# Altium footprint library hphonglib.PcbLib: 1250 footprints (part 2 of 79)
Each footprint in its own frame and in the unit in brackets; x right, y up, seen from the top. Pads: shape width x height; smd on the part's side, far side on the other; paste and mask are expansions set on the pad; w line width, h text height; cw(c..) or ccw(c..) is an arc to the next point about the centre after c.
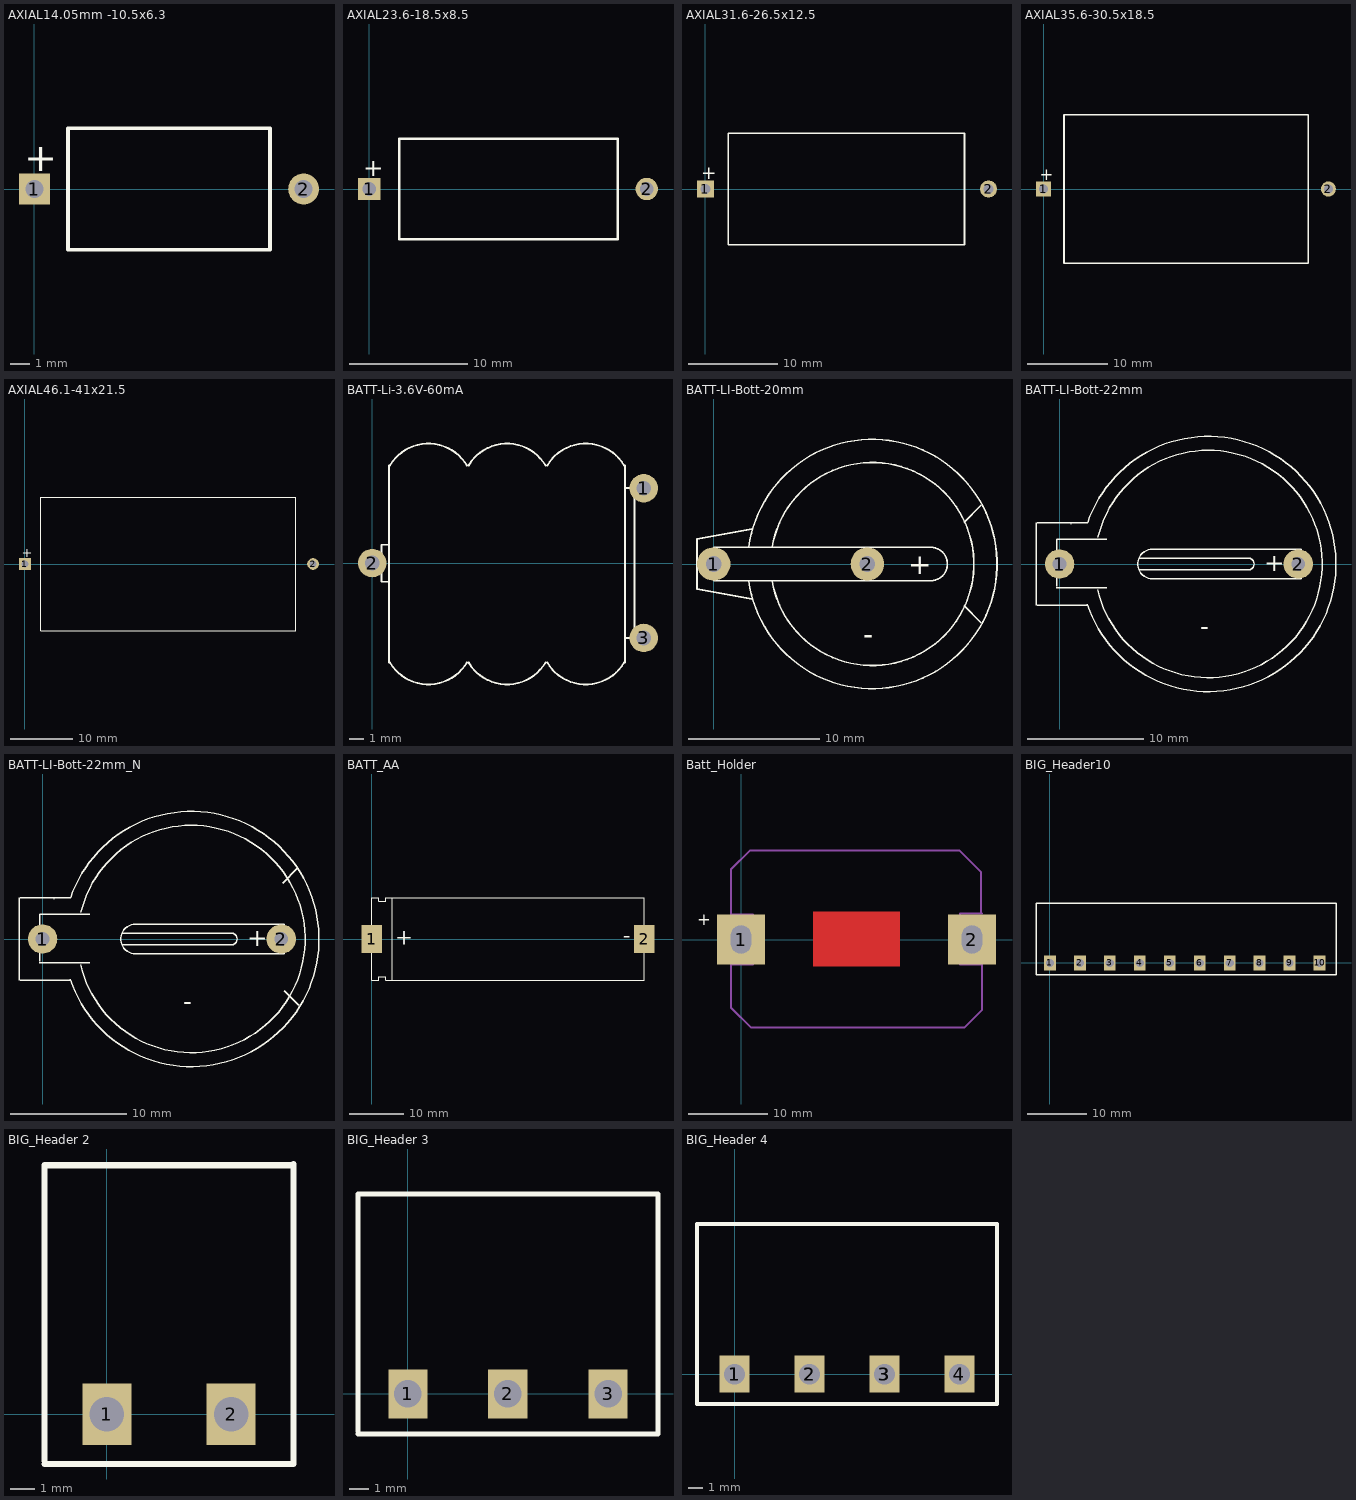
[diagram p1: the footprints below, top view; thin cyan lines are the x and y axes]

## AXIAL14.05mm -10.5x6.3 [mm] "Capacitor, Axial, Polarised; Body 10.5 x 6.3 mm (LxDia. max), Lead Dia. 0.6 mm (typ)"
height 5.08
pads (2):
  rect 1.6x1.6 hole 0.95: 1(0,0)
  round 1.6 hole 0.95: 2(13.97,0)
Top Overlay:
  lines w0.2: 1.735,-3.15 1.735,3.15 12.235,3.15 12.235,-3.15 1.735,-3.15
  text "+" at -0.54,0.925 h1.5

## AXIAL23.6-18.5x8.5 [mm] "Capacitor, Axial, Polarised; Body 18.5 x 8.5 mm (LxDia. max), Lead Dia. 0.8 mm (typ)"
height 5.08
pads (2):
  rect 1.9x1.9 hole 1.15: 1(0,0)
  round 1.9 hole 1.15: 2(23.495,0)
Top Overlay:
  lines w0.2: 2.55,-4.25 2.55,4.25 21.05,4.25 21.05,-4.25 2.55,-4.25
  text "+" at -0.5,1.075 h1.5

## AXIAL31.6-26.5x12.5 [mm] "Capacitor, Axial, Polarised; Body 26.5 x 12.5 mm (LxDia. max), Lead Dia. 0.8 mm (typ)"
height 5.08
pads (2):
  rect 1.9x1.9 hole 1.15: 1(0,0)
  round 1.9 hole 1.15: 2(31.75,0)
Top Overlay:
  lines w0.2: 2.55,-6.25 29.05,-6.25 29.05,6.25 2.55,6.25 2.55,-6.25
  text "+" at -0.5,1.075 h1.5

## AXIAL35.6-30.5x18.5 [mm] "Capacitor, Axial, Polarised; Body 30.5 x 18.5 mm (LxDia. max), Lead Dia. 0.8 mm (typ)"
height 5.08
pads (2):
  rect 1.9x1.9 hole 1.15: 1(0,0)
  round 1.9 hole 1.15: 2(35.56,0)
Top Overlay:
  lines w0.2: 2.55,-9.25 33.05,-9.25 33.05,9.25 2.55,9.25 2.55,-9.25
  text "+" at -0.5,1.075 h1.5

## AXIAL46.1-41x21.5 [mm] "Capacitor, Axial, Polarised; Body 41 x 21.5 mm (LxDia. max), Lead Dia. 0.8 mm (typ)"
height 5.08
pads (2):
  rect 1.9x1.9 hole 1.15: 1(0,0)
  round 1.9 hole 1.15: 2(46.355,0)
Top Overlay:
  lines w0.2: 2.55,-10.75 43.55,-10.75 43.55,10.75 2.55,10.75 2.55,-10.75
  text "+" at -0.5,1.075 h1.5

## BAT_LI_3.3V [mm]
3D body "Battery, CR2032.STEP": height 0.51, standoff -2.67, extent -9.982,-9.957 10.033,10.058

## BATT-Li-3.6V-60mA [mil]
pads (3):
  round 76 hole 39.37 unplated: 1(725,200) 2(0,0) 3(725,-200)
Top Overlay:
  lines w5: 44,-50 25,-50 25,49 44,49 ; 45,-265 45,260 ; 47.08,-265.14 ccw(c150,-205) 253.02,-264.96 ; 47.08,260.14 cw(c150,200) 253.02,259.96 ; 257.08,-265.14 ccw(c360,-205) 463.02,-264.96 ; 257.08,260.14 cw(c360,200) 463.02,259.96 ; 467.08,-265.14 ccw(c570,-205) 673.02,-264.96 ; 467.08,260.14 cw(c570,200) 673.02,259.96 ; 675,-265 675,260 ; 675,-200 700,-200 700,200 675,200
Mechanical 1:
  text "3.6 V" at 225,100 h60
  text "60mA" at 250,-25 h60
  text "+" at 597.64,-30.4 h60.8

## BATT-LI-Bott-20mm [mil]
pads (2):
  round 100 hole 47.24 unplated: 1(0,0) 2(460,0)
Top Overlay:
  lines w5: 105,-50.03 ccw(c475,0) 105,50.03 ; 115,-105 -50,-75 -50,75 115,105 ; 175.03,-50.2 ccw(c475,0) 175.03,50.2 ; 750,-125 800,-175 ; 750,125 800,175 ; 0,-50 650,-50 ccw(c650,0) 650,50 0,50 0,-50
  text "+" at 582.64,-30.4 h60.8
  text "-" at 447.64,-240.4 h60.8

## BATT-LI-Bott-22mm [mil]
pads (2):
  round 100 hole 47.24 unplated: 1(0,0) 2(810,0)
Top Overlay:
  lines w5: -80,-140 -80,140 ; -75.45,-140 95,-140 ; -75.45,140 95,140 ; -10.63,-80.04 159.83,-80.04 ; -9.78,-75 -9.78,83.62 160.68,83.62 ; 38.72,137.04 40.28,135.96 ; 94.15,-136.95 ccw(c505,0) 95.16,139.94 ; 129.15,-87.15 ccw(c505,0) 130.07,91.05 ; 270,-20 640,-20 ccw(c640,0) 640,20 270,20 ; 315,-50 cw(c315,0) 315,50 820,50 820,-50 315,-50
  text "+" at 695,-25 h60.8
  text "-" at 477.64,-240.4 h60.8
3D body: height 275.59, standoff 3.94, extent 93.5,-433.07 507.87,-79.72
3D body: height 275.59, standoff 7.87, extent 90.55,82.68 510.83,433.07
3D body: height 275.59, standoff 7.87, extent 507.87,-435.04 937.99,431.1
3D body: height 59.06, standoff 39.37, extent 264.76,-51.18 812.01,49.21
3D body: height 59.06, standoff 39.37, extent 4.92,-69.88 122.05,-28.54
3D body: height 59.06, standoff 39.37, extent 4.43,31.25 121.56,72.59
3D body: height 283.46, standoff 39.37, extent 120.08,-71.15 148.91,72.83
3D body: height 283.46, standoff 39.37, extent -19.68,-88.58 8.86,93.5
3D body: height 39.37, standoff 3.94, extent 120.08,-395.67 896.65,388.78
3D body: height 275.59, standoff 3.94, extent -80.71,-143.7 104.33,140.75

## BATT-LI-Bott-22mm_N [mil]
pads (2):
  round 100 hole 47.24 unplated: 1(0,0) 2(810,0)
Top Overlay:
  lines w5: -80,-140 -80,140 ; -75.45,-140 95,-140 ; -75.45,140 95,140 ; -10.63,-80.04 159.83,-80.04 ; -9.78,-75 -9.78,83.62 160.68,83.62 ; 38.72,137.04 40.28,135.96 ; 94.15,-136.95 ccw(c505,0) 95.16,139.94 ; 129.15,-87.15 ccw(c505,0) 130.07,91.05 ; 270,-20 640,-20 ccw(c640,0) 640,20 270,20 ; 815,190 865,240 ; 820,-175 870,-225 ; 315,-50 cw(c315,0) 315,50 820,50 820,-50 315,-50
  text "+" at 695,-25 h60.8
  text "-" at 477.64,-240.4 h60.8
3D body "Batt holder keystone 502.STEP": height 212, standoff -293, extent -27,-377 870,373

## BATT_AA [mm]
pads (2):
  rect 3.81x5.08 smd: 1(0,0) 2(50.165,0)
Top Overlay:
  lines w0.127: 3.81,-7.62 3.81,7.62 ; 0,-7.62 1.27,-7.62 1.27,-6.985 2.54,-6.985 2.54,-7.62 50.165,-7.62 50.165,7.62 2.54,7.62 2.54,6.985 1.27,6.985 1.27,7.62 0,7.62 0,-7.62
  text "-" at 47.658,1.448 h2.9
  text "+" at 7.653,1.448 h2.9
Mechanical 1:
  text "AA" at 22.86,-1.27 h2.9

## Batt_Holder [mil] "Battery Holders"
pads (2):
  rect 240x250 hole 102 slot 140 at 90 deg: 1(0,0) 2(1154,0)
Top Layer:
  rectangle: 360,-135 795,140
Top Overlay:
  text "+" at -220,70 h60
Mechanical 5:
  lines w10: 1205,130 1200,130 ; 1200,130 1095,130 1095,-125 1205,-125 1205,-350 1115,-440 50,-440 -50,-340 -50,-125 60,-125 60,125 -50,125 -50,350 45,445 1090,445 1200,335 1200,130
3D body: height 264, standoff 0, extent -50.02,-440.02 1205.02,445.02
3D body: height 400, standoff -100, extent 1130,-70 1180,70
3D body: height 100, standoff 0, extent -50,-125 60,125
3D body: height 100, standoff 0, extent 1095,-125 1205,130
3D body: height 400, standoff -100, extent -20,-70 25,70

## BIG_Header10 [mm]
pads (10):
  rect 2x2.5 hole 1.4: 1(0,0) 2(5.08,0) 3(10.16,0) 4(15.24,0) 5(20.32,0) 6(25.4,0) 7(30.48,0) 8(35.56,0) 9(40.64,0) 10(45.72,0)
Top Overlay:
  lines w0.254: 13.843,10.16 48.514,10.16 48.514,-2.032 27.94,-2.032 17.78,-2.032 7.62,-2.032 -2.362,-2.032 -2.362,10.16 17.78,10.16
3D body "User Library-BigHeader 5EHDR_1P.step": height 3.15, standoff -9.32, extent 38.14,-1.75 43.14,10.25
3D body "User Library-BigHeader 5EHDR_1P.step": height 3.15, standoff -9.32, extent 33.06,-1.75 38.06,10.25
3D body "User Library-BigHeader 5EHDR_1P.step": height 3.15, standoff -9.32, extent 27.98,-1.75 32.98,10.25
3D body "User Library-BigHeader 5EHDR_1P.step": height 3.15, standoff -9.32, extent 22.9,-1.75 27.9,10.25
3D body "User Library-BigHeader 5EHDR_1P.step": height 3.15, standoff -9.32, extent 17.82,-1.75 22.82,10.25
3D body "User Library-BigHeader 5EHDR_1P.step": height 3.15, standoff -9.32, extent 12.74,-1.75 17.74,10.25
3D body "User Library-BigHeader 5EHDR_1P.step": height 3.15, standoff -9.32, extent 7.66,-1.75 12.66,10.25
3D body "User Library-BigHeader 5EHDR_1P.step": height 3.15, standoff -9.32, extent 2.58,-1.75 7.58,10.25
3D body "User Library-BigHeader 5EHDR_1P.step": height 3.15, standoff -9.32, extent -2.5,-1.75 2.5,10.25
3D body "User Library-BigHeader 5EHDR_1P.step": height 3.15, standoff -9.32, extent 43.22,-1.75 48.22,10.25

## BIG_Header 2 [mm]
pads (2):
  rect 2x2.5 hole 1.4: 1(0,0) 2(5.08,0)
Top Overlay:
  lines w0.254: -2.54,-2.032 7.62,-2.032 7.62,10.211 ; -2.54,-1.905 -2.54,10.173 ; -2.54,10.16 7.62,10.16
3D body "User Library-BigHeader 5EHDR_1P.step": height 3.15, standoff -9.32, extent 2.58,-1.75 7.58,10.25
3D body "User Library-BigHeader 5EHDR_1P.step": height 3.15, standoff -9.32, extent -2.5,-1.75 2.5,10.25

## BIG_Header 3 [mm]
pads (3):
  rect 2x2.5 hole 1.4: 1(0,0) 2(5.08,0) 3(10.173,0)
Top Overlay:
  lines w0.254: -2.54,-2.032 12.713,-2.032 12.713,10.16 -2.54,10.16 -2.54,-1.905
3D body "User Library-BigHeader 5EHDR_1P.step": height 3.15, standoff -9.32, extent 7.673,-1.75 12.673,10.25
3D body "User Library-BigHeader 5EHDR_1P.step": height 3.15, standoff -9.32, extent 2.593,-1.75 7.593,10.25
3D body "User Library-BigHeader 5EHDR_1P.step": height 3.15, standoff -9.32, extent -2.5,-1.75 2.5,10.25

## BIG_Header 4 [mm]
pads (7):
  rect 2x2.5 hole 1.4: 1(0,0) 1(0,0) 2(5.08,0) 2(5.08,0) 3(10.16,0) 3(10.173,0) 4(15.24,0)
Top Overlay:
  lines w0.254: 12.713,-2.032 -2.54,-2.032 7.62,-2.032 17.78,-2.032 17.78,10.173 -2.527,10.173 -2.54,10.173 -2.54,-1.905 -2.54,10.16 ; 12.713,10.16 -2.54,10.16 ; 17.78,10.16 -2.54,10.16
3D body "User Library-BigHeader 5EHDR_1P.step": height 3.15, standoff -9.32, extent -2.5,-1.75 2.5,10.25
3D body "User Library-BigHeader 5EHDR_1P.step": height 3.15, standoff -9.32, extent 2.58,-1.75 7.58,10.25
3D body "User Library-BigHeader 5EHDR_1P.step": height 3.15, standoff -9.32, extent 7.66,-1.75 12.66,10.25
3D body "User Library-BigHeader 5EHDR_1P.step": height 3.15, standoff -9.32, extent 12.74,-1.75 17.74,10.25